# Altium footprint library Capacitors.PcbLib: 93 footprints (part 4 of 6)
Each footprint in its own frame and in the unit in brackets; x right, y up, seen from the top. Pads: shape width x height; smd on the part's side, far side on the other; paste and mask are expansions set on the pad; w line width, h text height; cw(c..) or ccw(c..) is an arc to the next point about the centre after c.
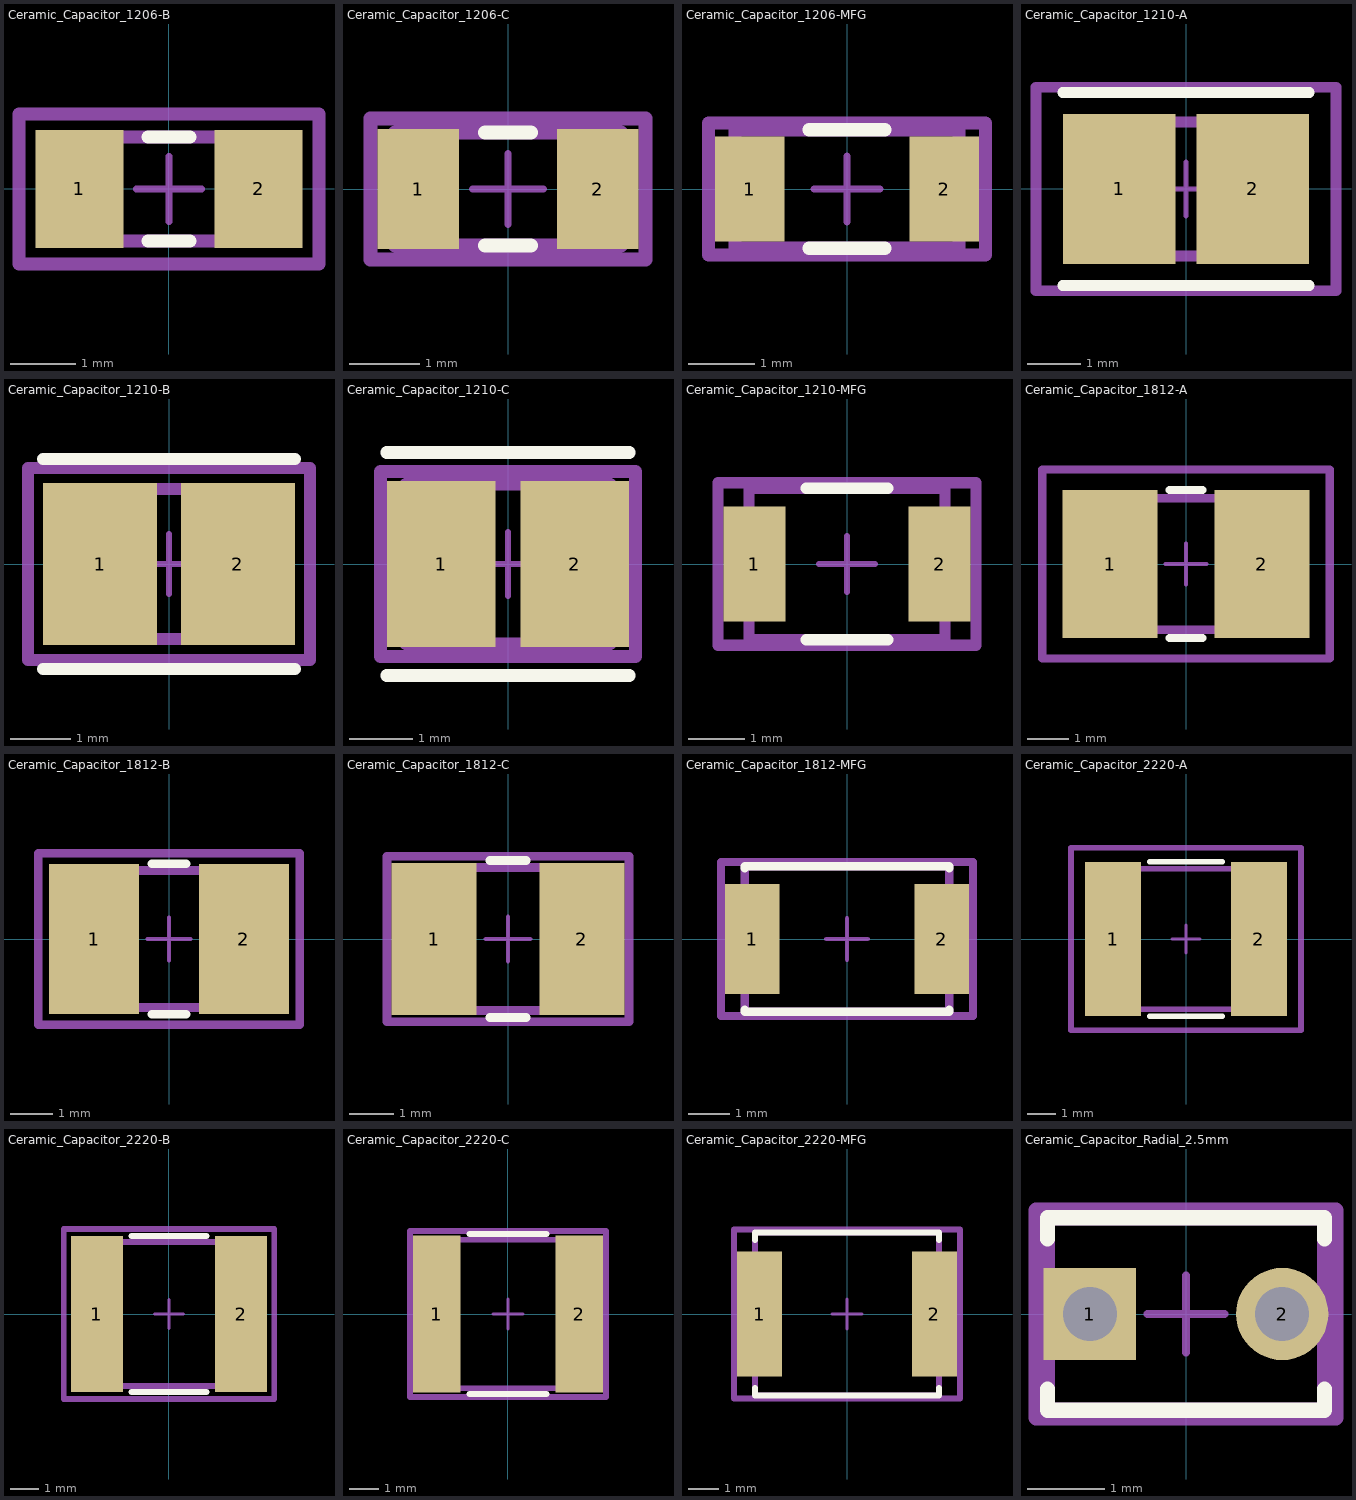
[diagram p3: the footprints below, top view; thin cyan lines are the x and y axes]

## Ceramic_Capacitor_1206-B [mm]
pads (2):
  rect 1.355x1.806 smd paste+0 mask+0: 1(-1.376,0) 2(1.376,0)
Top Overlay:
  lines w0.2: -0.323,-0.8 0.323,-0.8 ; -0.323,0.8 0.323,0.8
Top Assembly:
  lines w0.2: -2.303,-1.153 -2.303,1.153 2.303,1.153 2.303,-1.153 -2.303,-1.153
Top 3D Body:
  lines w0.2: -1.6,-0.8 -1.6,0.8 1.6,0.8 1.6,-0.8 -1.6,-0.8
Top Courtyard:
  lines w0.2: -2.303,-1.153 -2.303,1.153 2.303,1.153 2.303,-1.153 -2.303,-1.153
Top Component Center:
  lines w0.1: -0.5,0 0.5,0 ; 0,-0.5 0,0.5
3D body "Cap_Murata_Electronics_North_America_GRM31CR61H106KA12L_eec.STEP": height 0.25, standoff 0, extent -2.303,-1.153 2.303,1.153

## Ceramic_Capacitor_1206-C [mm]
pads (2):
  rect 1.155x1.706 smd paste+0 mask+0: 1(-1.276,0) 2(1.276,0)
Top Overlay:
  lines w0.2: -0.323,-0.8 0.323,-0.8 ; -0.323,0.8 0.323,0.8
Top Assembly:
  lines w0.2: -1.953,-1 -1.953,1 1.953,1 1.953,-1 -1.953,-1
Top 3D Body:
  lines w0.2: -1.6,-0.8 -1.6,0.8 1.6,0.8 1.6,-0.8 -1.6,-0.8
Top Courtyard:
  lines w0.2: -1.953,-1 -1.953,1 1.953,1 1.953,-1 -1.953,-1
Top Component Center:
  lines w0.1: -0.5,0 0.5,0 ; 0,-0.5 0,0.5
3D body "Cap_Murata_Electronics_North_America_GRM31CR61H106KA12L_eec.STEP": height 0.25, standoff 0, extent -1.953,-1 1.953,1

## Ceramic_Capacitor_1206-MFG [mm]
pads (2):
  rect 1.05x1.6 smd paste+0 mask+0: 1(-1.475,0) 2(1.475,0)
Top Overlay:
  lines w0.2: -0.575,-0.9 0.575,-0.9 ; -0.575,0.9 0.575,0.9
Top Assembly:
  lines w0.2: -2.1,-1 2.1,-1 2.1,1 -2.1,1 -2.1,-1
Top 3D Body:
  lines w0.2: -1.7,-0.9 1.7,-0.9 1.7,0.9 -1.7,0.9 -1.7,-0.9
Top Courtyard:
  lines w0.2: -2.1,-1 2.1,-1 2.1,1 -2.1,1 -2.1,-1
Top Component Center:
  lines w0.1: -0.5,0 0.5,0 ; 0,-0.5 0,0.5
3D body "Cap_Murata_Electronics_North_America_GRM31CR61H106KA12L_eec.STEP": height 0.25, standoff 0, extent -2.1,-1 2.1,1

## Ceramic_Capacitor_1210-A [mm]
pads (2):
  rect 2.103x2.806 smd paste+0 mask+0: 1(-1.251,0) 2(1.251,0)
Top Overlay:
  lines w0.2: -2.302,-1.803 2.302,-1.803 ; -2.302,1.803 2.302,1.803
Top Assembly:
  lines w0.2: -2.802,-1.903 2.802,-1.903 2.802,1.903 -2.802,1.903 -2.802,-1.903
Top 3D Body:
  lines w0.2: -1.6,-1.25 1.6,-1.25 1.6,1.25 -1.6,1.25 -1.6,-1.25
Top Courtyard:
  lines w0.2: -2.802,-1.903 2.802,-1.903 2.802,1.903 -2.802,1.903 -2.802,-1.903
Top Component Center:
  lines w0.1: -0.5,0 0.5,0 ; 0,-0.5 0,0.5
3D body "Cap_Murata_GRM32DR71E106KA12L_eec.STEP": height 0.25, standoff 0, extent -2.802,-1.903 2.802,1.903

## Ceramic_Capacitor_1210-B [mm]
pads (2):
  rect 1.903x2.706 smd paste+0 mask+0: 1(-1.151,0) 2(1.151,0)
Top Overlay:
  lines w0.2: -2.102,-1.753 2.102,-1.753 ; -2.102,1.753 2.102,1.753
Top Assembly:
  lines w0.2: -2.352,-1.603 2.352,-1.603 2.352,1.603 -2.352,1.603 -2.352,-1.603
Top 3D Body:
  lines w0.2: -1.6,-1.25 1.6,-1.25 1.6,1.25 -1.6,1.25 -1.6,-1.25
Top Courtyard:
  lines w0.2: -2.352,-1.603 2.352,-1.603 2.352,1.603 -2.352,1.603 -2.352,-1.603
Top Component Center:
  lines w0.1: -0.5,0 0.5,0 ; 0,-0.5 0,0.5
3D body "Cap_Murata_GRM32DR71E106KA12L_eec.STEP": height 0.25, standoff 0, extent -2.352,-1.603 2.352,1.603

## Ceramic_Capacitor_1210-C [mm]
pads (2):
  rect 1.703x2.606 smd paste+0 mask+0: 1(-1.051,0) 2(1.051,0)
Top Overlay:
  lines w0.2: -1.902,-1.75 1.902,-1.75 ; -1.902,1.75 1.902,1.75
Top Assembly:
  lines w0.2: -2.002,-1.45 -2.002,1.45 2.002,1.45 2.002,-1.45 -2.002,-1.45
Top 3D Body:
  lines w0.2: -1.6,-1.25 -1.6,1.25 1.6,1.25 1.6,-1.25 -1.6,-1.25
Top Courtyard:
  lines w0.2: -2.002,-1.45 -2.002,1.45 2.002,1.45 2.002,-1.45 -2.002,-1.45
Top Component Center:
  lines w0.1: -0.5,0 0.5,0 ; 0,-0.5 0,0.5
3D body "Cap_Murata_GRM32DR71E106KA12L_eec.STEP": height 0.25, standoff 0, extent -2.002,-1.45 2.002,1.45

## Ceramic_Capacitor_1210-MFG [mm]
pads (2):
  rect 1.1x2.05 smd paste+0 mask+0: 1(-1.65,0) 2(1.65,0)
Top Overlay:
  lines w0.2: -0.725,-1.35 0.725,-1.35 ; -0.725,1.35 0.725,1.35
Top Assembly:
  lines w0.2: -2.3,-1.45 2.3,-1.45 2.3,1.45 -2.3,1.45 -2.3,-1.45
Top 3D Body:
  lines w0.2: -1.75,-1.35 1.75,-1.35 1.75,1.35 -1.75,1.35 -1.75,-1.35
Top Courtyard:
  lines w0.2: -2.3,-1.45 2.3,-1.45 2.3,1.45 -2.3,1.45 -2.3,-1.45
Top Component Center:
  lines w0.1: -0.5,0 0.5,0 ; 0,-0.5 0,0.5
3D body "Cap_Murata_GRM32DR71E106KA12L_eec.STEP": height 0.25, standoff 0, extent -2.3,-1.45 2.3,1.45

## Ceramic_Capacitor_1812-A [mm]
pads (2):
  rect 2.302x3.604 smd paste+0 mask+0: 1(-1.85,0) 2(1.85,0)
Top Overlay:
  lines w0.2: -0.399,-1.802 0.399,-1.802 ; -0.399,1.802 0.399,1.802
Top Assembly:
  lines w0.2: -3.502,-2.302 3.502,-2.302 3.502,2.302 -3.502,2.302 -3.502,-2.302
Top 3D Body:
  lines w0.2: -2.25,-1.6 2.25,-1.6 2.25,1.6 -2.25,1.6 -2.25,-1.6
Top Courtyard:
  lines w0.2: -3.502,-2.302 3.502,-2.302 3.502,2.302 -3.502,2.302 -3.502,-2.302
Top Component Center:
  lines w0.1: -0.5,0 0.5,0 ; 0,-0.5 0,0.5
3D body "Cap_Murata_GRM43D7U2H153JW31K_eec.STEP": height 0.25, standoff 0, extent -3.502,-2.302 3.502,2.302

## Ceramic_Capacitor_1812-B [mm]
pads (2):
  rect 2.102x3.504 smd paste+0 mask+0: 1(-1.75,0) 2(1.75,0)
Top Overlay:
  lines w0.2: -0.399,-1.752 0.399,-1.752 ; -0.399,1.752 0.399,1.752
Top Assembly:
  lines w0.2: -3.052,-2.002 -3.052,2.002 3.052,2.002 3.052,-2.002 -3.052,-2.002
Top 3D Body:
  lines w0.2: -2.25,-1.6 -2.25,1.6 2.25,1.6 2.25,-1.6 -2.25,-1.6
Top Courtyard:
  lines w0.2: -3.052,-2.002 -3.052,2.002 3.052,2.002 3.052,-2.002 -3.052,-2.002
Top Component Center:
  lines w0.1: -0.5,0 0.5,0 ; 0,-0.5 0,0.5
3D body "Cap_Murata_GRM43D7U2H153JW31K_eec.STEP": height 0.25, standoff 0, extent -3.052,-2.002 3.052,2.002

## Ceramic_Capacitor_1812-C [mm]
pads (2):
  rect 1.902x3.404 smd paste+0 mask+0: 1(-1.65,0) 2(1.65,0)
Top Overlay:
  lines w0.2: -0.399,-1.75 0.399,-1.75 ; -0.399,1.75 0.399,1.75
Top Assembly:
  lines w0.2: -2.702,-1.85 2.702,-1.85 2.702,1.85 -2.702,1.85 -2.702,-1.85
Top 3D Body:
  lines w0.2: -2.25,-1.6 2.25,-1.6 2.25,1.6 -2.25,1.6 -2.25,-1.6
Top Courtyard:
  lines w0.2: -2.702,-1.85 2.702,-1.85 2.702,1.85 -2.702,1.85 -2.702,-1.85
Top Component Center:
  lines w0.1: -0.5,0 0.5,0 ; 0,-0.5 0,0.5
3D body "Cap_Murata_GRM43D7U2H153JW31K_eec.STEP": height 0.25, standoff 0, extent -2.702,-1.85 2.702,1.85

## Ceramic_Capacitor_1812-MFG [mm]
pads (2):
  rect 1.3x2.65 smd paste+0 mask+0: 1(-2.275,0) 2(2.275,0)
Top Overlay:
  lines w0.2: -2.45,-1.7 -2.45,-1.75 2.45,-1.75 2.45,-1.7 ; -2.45,1.7 -2.45,1.75 2.45,1.75 2.45,1.7
Top Assembly:
  lines w0.2: -3.025,-1.85 3.025,-1.85 3.025,1.85 -3.025,1.85 -3.025,-1.85
Top 3D Body:
  lines w0.2: -2.45,-1.75 2.45,-1.75 2.45,1.75 -2.45,1.75 -2.45,-1.75
Top Courtyard:
  lines w0.2: -3.025,-1.85 3.025,-1.85 3.025,1.85 -3.025,1.85 -3.025,-1.85
Top Component Center:
  lines w0.1: -0.5,0 0.5,0 ; 0,-0.5 0,0.5
3D body "Cap_Murata_GRM43D7U2H153JW31K_eec.STEP": height 0.25, standoff 0, extent -3.025,-1.85 3.025,1.85

## Ceramic_Capacitor_2220-A [mm]
pads (2):
  rect 2.002x5.503 smd paste+0 mask+0: 1(-2.6,0) 2(2.6,0)
Top Overlay:
  lines w0.2: -1.299,-2.752 1.299,-2.752 ; -1.299,2.752 1.299,2.752
Top Assembly:
  lines w0.2: -4.102,-3.252 -4.102,3.252 4.102,3.252 4.102,-3.252 -4.102,-3.252
Top 3D Body:
  lines w0.2: -2.85,-2.5 -2.85,2.5 2.85,2.5 2.85,-2.5 -2.85,-2.5
Top Courtyard:
  lines w0.2: -4.102,-3.252 -4.102,3.252 4.102,3.252 4.102,-3.252 -4.102,-3.252
Top Component Center:
  lines w0.1: -0.5,0 0.5,0 ; 0,-0.5 0,0.5
3D body "Cap_Murata_GA355DR7GF472KW01L_eec.STEP": height 0.25, standoff 0, extent -4.102,-3.252 4.102,3.252

## Ceramic_Capacitor_2220-B [mm]
pads (2):
  rect 1.802x5.403 smd paste+0 mask+0: 1(-2.5,0) 2(2.5,0)
Top Overlay:
  lines w0.2: -1.299,-2.702 1.299,-2.702 ; -1.299,2.702 1.299,2.702
Top Assembly:
  lines w0.2: -3.652,-2.952 -3.652,2.952 3.652,2.952 3.652,-2.952 -3.652,-2.952
Top 3D Body:
  lines w0.2: -2.85,-2.5 -2.85,2.5 2.85,2.5 2.85,-2.5 -2.85,-2.5
Top Courtyard:
  lines w0.2: -3.652,-2.952 -3.652,2.952 3.652,2.952 3.652,-2.952 -3.652,-2.952
Top Component Center:
  lines w0.1: -0.5,0 0.5,0 ; 0,-0.5 0,0.5
3D body "Cap_Murata_GA355DR7GF472KW01L_eec.STEP": height 0.25, standoff 0, extent -3.652,-2.952 3.652,2.952

## Ceramic_Capacitor_2220-C [mil]
pads (2):
  rect 63.09x208.78 smd paste+0 mask+0: 1(-94.5,0) 2(94.5,0)
Top Overlay:
  lines w7.87: -51.14,-106.3 51.14,-106.3 ; -51.14,106.3 51.14,106.3
Top Assembly:
  lines w7.87: -129.98,-110.24 -129.98,110.24 129.98,110.24 129.98,-110.24 -129.98,-110.24
Top 3D Body:
  lines w7.87: -112.2,-98.43 -112.2,98.43 112.2,98.43 112.2,-98.43 -112.2,-98.43
Top Courtyard:
  lines w7.87: -129.98,-110.24 -129.98,110.24 129.98,110.24 129.98,-110.24 -129.98,-110.24
Top Component Center:
  lines w3.94: -19.68,0 19.68,0 ; 0,-19.68 0,19.68
3D body "Cap_Murata_GA355DR7GF472KW01L_eec.STEP": height 10, standoff 0, extent -129.98,-110.24 129.98,110.24

## Ceramic_Capacitor_2220-MFG [mm]
pads (2):
  rect 1.5x4.15 smd paste+0 mask+0: 1(-2.9,0) 2(2.9,0)
Top Overlay:
  lines w0.2: -3.05,-2.45 -3.05,-2.7 3.05,-2.7 3.05,-2.45 ; -3.05,2.45 -3.05,2.7 3.05,2.7 3.05,2.45
Top Assembly:
  lines w0.2: -3.75,-2.8 3.75,-2.8 3.75,2.8 -3.75,2.8 -3.75,-2.8
Top 3D Body:
  lines w0.2: -3.05,-2.7 3.05,-2.7 3.05,2.7 -3.05,2.7 -3.05,-2.7
Top Courtyard:
  lines w0.2: -3.75,-2.8 3.75,-2.8 3.75,2.8 -3.75,2.8 -3.75,-2.8
Top Component Center:
  lines w0.1: -0.5,0 0.5,0 ; 0,-0.5 0,0.5
3D body "Cap_Murata_GA355DR7GF472KW01L_eec.STEP": height 0.25, standoff 0, extent -3.75,-2.8 3.75,2.8

## Ceramic_Capacitor_Radial_2.5mm [mm]
pads (2):
  rect 1.2x1.2 hole 0.7 paste-2539.97 mask+0: 1(-1.25,0)
  round 1.2 hole 0.7 paste-2539.97 mask+0: 2(1.25,0)
Top Overlay:
  lines w0.2: -1.8,-0.975 -1.8,-1.25 1.8,-1.25 1.8,-0.975 ; -1.8,0.975 -1.8,1.25 1.8,1.25 1.8,0.975
Top Assembly:
  lines w0.2: -1.95,-1.35 -1.95,1.35 1.95,1.35 1.95,-1.35 -1.95,-1.35
Top 3D Body:
  lines w0.2: -1.8,-1.25 -1.8,1.25 1.8,1.25 1.8,-1.25 -1.8,-1.25
Top Courtyard:
  lines w0.2: -1.95,-1.35 -1.95,1.35 1.95,1.35 1.95,-1.35 -1.95,-1.35
Top Component Center:
  lines w0.1: -0.5,0 0.5,0 ; 0,-0.5 0,0.5
3D body "Cap_Murata_RCER72A152K0DBH03A_eec.STEP": height 0.25, standoff 0, extent -1.95,-1.35 1.95,1.35